# Altium footprint library TimeCard-NIC-V1.PcbLib: 104 footprints (part 1 of 7)
Each footprint in its own frame and in the unit in brackets; x right, y up, seen from the top. Pads: shape width x height; smd on the part's side, far side on the other; paste and mask are expansions set on the pad; w line width, h text height; cw(c..) or ccw(c..) is an arc to the next point about the centre after c.
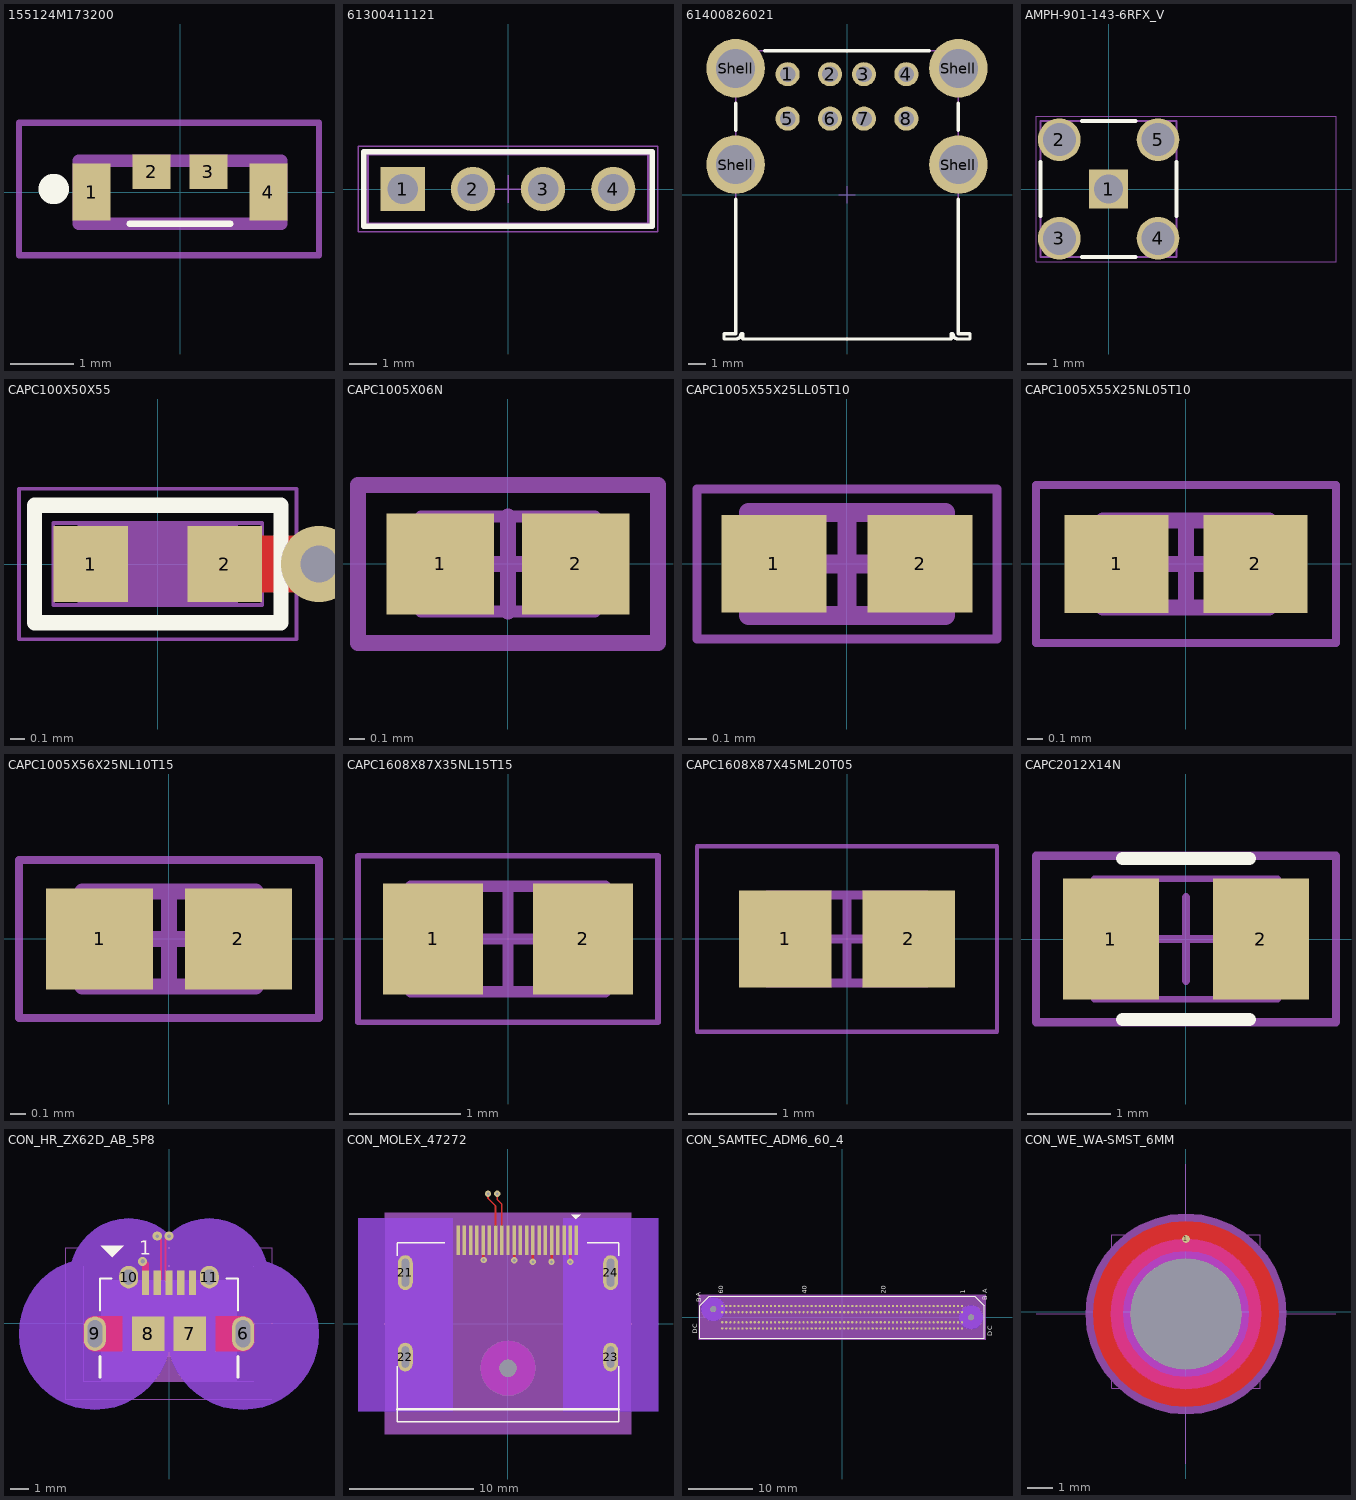
[diagram p0: the footprints below, top view; thin cyan lines are the x and y axes]

## 155124M173200 [mm]
height 1.7
pads (4):
  rect 0.6x0.9 smd: 1(-1.4,0) 4(1.4,0)
  rect 0.6x0.55 smd: 2(-0.45,0.325) 3(0.45,0.325)
Top Overlay:
  lines w0.1: -0.8,-0.5 0.8,-0.5
  lines w0.381: -2,0 cw(c-2,0.05) -2,0.1 cw(c-2,0.05) -2,0
Mechanical 13:
  lines w0.2: -1.6,-0.5 1.6,-0.5 1.6,0.5 -1.6,0.5 -1.6,-0.5
Mechanical 15:
  lines w0.1: -2.55,-1 2.2,-1 2.2,1.1 -2.55,1.1 -2.55,-1
3D body "155124M173200.stp": height 0.5, standoff -0.5, extent -1.6,0 1.6,1.49

## 61300411121 [mm] "Pin Header, pitch 2.54 mm, THT, Vertical, single row, 4p"
height 8.54
pads (4):
  rect 1.6x1.6 hole 1.1: 1(-3.81,0)
  round 1.6 hole 1.1: 2(-1.27,0) 3(1.27,0) 4(3.81,0)
Top Overlay:
  lines w0.2: -5.23,-1.345 5.23,-1.345 5.23,1.345 -5.23,1.345 -5.23,-1.345
Mechanical 13:
  lines w0.1: -5.08,-1.27 -5.08,1.27 5.08,1.27 5.08,-1.27 -5.08,-1.27
Mechanical 15:
  lines w0.05: -0.5,0 0.5,0 ; 0,-0.5 0,0.5 ; -5.43,-1.545 -5.43,1.545 5.43,1.545 5.43,-1.545 -5.43,-1.545
3D body "61300411121.stp": height 8.57, standoff -2.97, extent -5.08,-1.27 5.08,1.27

## 61400826021 [mm] "USB 2.0 Type A Horizontal Dual Stacked"
height 15.34
pads (12):
  round 1.42 hole 0.92: 1(-3.5,7.11) 2(-1,7.11) 3(1,7.11) 4(3.5,7.11) 5(-3.5,4.49) 6(-1,4.49) 7(1,4.49) 8(3.5,4.49)
  round 3.45 hole 2.3: Shell(-6.57,1.78) Shell(-6.57,7.46) Shell(6.57,1.78) Shell(6.57,7.46)
Top Overlay:
  lines w0.2: -6.55,-0.25 -6.55,-8.2 -7.25,-8.2 -7.25,-8.5 -6.56,-8.5 ccw(c-6.55,-8.2) -6.25,-8.2 -6.15,-8.2 -6.15,-8.5 6.15,-8.5 6.15,-8.2 6.25,-8.2 ccw(c6.55,-8.2) 6.56,-8.5 7.25,-8.5 7.25,-8.2 6.55,-8.2 6.55,-0.25 ; -6.55,3.81 -6.55,5.4 ; -4.85,8.5 4.85,8.5 ; 6.55,3.81 6.55,5.4
Mechanical 13:
  lines w0.1: -7.25,-8.5 -6.56,-8.5 ccw(c-6.55,-8.2) -6.25,-8.2 -6.15,-8.2 -6.15,-8.5 6.15,-8.5 6.15,-8.2 6.25,-8.2 ccw(c6.55,-8.2) 6.56,-8.5 7.25,-8.5 7.25,-8.2 6.55,-8.2 6.55,8.5 -6.55,8.5 -6.55,-8.2 -7.25,-8.2 -7.25,-8.5
Mechanical 15:
  lines w0.05: -0.5,0 0.5,0 ; 0,-0.5 0,0.5
3D body "61400826021.stp": height 15.93, standoff -3.91, extent -7.912,-8.5 7.912,8.65

## AMPH-901-143-6RFX_V [mm] "THD, 5-Leads, Body 7x7mm, Pitch 2.54mm"
height 9.86
pads (5):
  rect 2x2 hole 1.5: 1(0,0)
  round 2.2 hole 1.7: 2(-2.54,2.54) 3(-2.54,-2.54) 4(2.54,-2.54) 5(2.54,2.54)
Top Overlay:
  lines w0.2: -3.5,-1.38 -3.5,1.38 ; -1.38,-3.5 1.38,-3.5 ; -1.38,3.5 1.38,3.5 ; 3.5,-1.38 3.5,1.38
Mechanical 13:
  lines w0.1: -3.5,-3.5 3.5,-3.5 3.5,3.5 -3.5,3.5 -3.5,-3.5
Mechanical 15:
  lines w0.05: -3.74,-3.74 11.7,-3.74 11.7,3.74 -3.74,3.74 -3.74,-3.74
3D body: height 9.86, standoff 0, extent -3.55,-3.55 3.55,3.55

## CAPC100X50X55 [mm] "CAPC100X50X55"
height 10.85
pads (2):
  rect 0.5x0.51 smd: 1(-0.45,0) 2(0.45,0)
via 1.081,0 diameter 0.508 hole 0.249
Top Layer:
  lines w0.381: 0.45,0 1.081,0
Top Overlay:
  lines w0.102: -0.826,-0.394 0.826,-0.394 0.826,0.394 -0.826,0.394 -0.826,-0.394
  text ".Designator" at -0.762,0.889 h0.76
Top 3D Body:
  region: -0.525,-0.275 -0.525,0.275 0.525,0.275 0.525,-0.275
Top Courtyard:
  lines w0.025: -0.7,-0.275 -0.7,0.275 0.7,0.275 0.7,-0.275 -0.7,-0.275
Top Assembly:
  lines w0.025: -0.525,-0.275 -0.525,0.275 0.525,0.275 0.525,-0.275 -0.525,-0.275
Top Component Center:
  circle w0.025: c0,0 r0.18
Bottom Component Center:
  text "2" at 0.45,-0.254 h0.64
  text "1" at -0.45,-0.254 h0.64
Top Component Outline:
  text "CHECKED: C. HENLEY 7/29/10" at -12.446,5.309 h0.64
  text "PADSTACKS: R50_51" at -12.522,10.287 h0.64
  text "DIM IN INCH [MM]" at -12.522,7.747 h0.64
  text "COMP HT: 55 mm" at -12.522,12.827 h0.64
  text "SYMB NAME: 0402" at -12.522,15.367 h0.64
  text "MFR:AVX" at -12.522,17.907 h0.64
  text "UPDATED SOLDERMASK TO BE .1016 OVER PAD." at -21.9,-3.9 h0.64
Mechanical 30:
  lines w0.025: -0.93,-0.505 -0.93,0.505 0.93,0.505 0.93,-0.505 -0.93,-0.505
3D body: height 3.81, standoff 0, extent -0.525,-0.275 0.525,0.275

## CAPC1005X06N [mm] "Chip Capacitor, 0402, 2-Leads, Body 1.00x0.50mm, IPC Medium Density"
height 0.6
pads (2):
  rect 0.68x0.64 smd: 1(-0.43,0) 2(0.43,0)
Mechanical 13:
  lines w0.076: -0.55,-0.3 0.55,-0.3 0.55,0.3 -0.55,0.3 -0.55,-0.3
  text ".Designator" at 2.208,-0.516 h1.02
Mechanical 15:
  lines w0.102: -0.3,0 0.3,0 ; 0,-0.3 0,0.3 ; -0.95,-0.5 0.95,-0.5 0.95,0.5 -0.95,0.5 -0.95,-0.5
3D body: height 0.6, standoff 0, extent 0.32,-0.3 0.55,0.3
3D body: height 0.6, standoff 0, extent -0.55,-0.3 -0.32,0.3
3D body: height 0.6, standoff 0, extent -0.32,-0.3 0.32,0.3

## CAPC1005X55X25LL05T10 [mm] "Chip Capacitor, 2-Leads, Body 1.00x0.50mm, IPC High Density"
height 0.55
pads (2):
  rect 0.56x0.52 smd: 1(-0.39,0) 2(0.39,0)
Mechanical 13:
  lines w0.1: -0.525,-0.275 -0.525,0.275 0.525,0.275 0.525,-0.275 -0.525,-0.275
Mechanical 15:
  lines w0.05: -0.8,-0.4 -0.8,0.4 0.8,0.4 0.8,-0.4 -0.8,-0.4
  lines w0.1: -0.275,0 0.275,0 ; 0,-0.275 0,0.275
3D body: height 0.55, standoff 0, extent -0.275,-0.275 0.275,0.275
3D body: height 0.55, standoff 0, extent -0.525,-0.275 -0.275,0.275
3D body: height 0.55, standoff 0, extent 0.275,-0.275 0.525,0.275

## CAPC1005X55X25NL05T10 [mm] "Chip Capacitor, 2-Leads, Body 1.00x0.50mm, IPC Medium Density"
height 0.55
pads (2):
  rect 0.66x0.62 smd: 1(-0.44,0) 2(0.44,0)
Mechanical 13:
  lines w0.1: -0.525,-0.275 -0.525,0.275 0.525,0.275 0.525,-0.275 -0.525,-0.275
Mechanical 15:
  lines w0.05: -0.95,-0.5 -0.95,0.5 0.95,0.5 0.95,-0.5 -0.95,-0.5
  lines w0.1: -0.275,0 0.275,0 ; 0,-0.275 0,0.275
3D body: height 0.55, standoff 0, extent -0.275,-0.275 0.275,0.275
3D body: height 0.55, standoff 0, extent -0.525,-0.275 -0.275,0.275
3D body: height 0.55, standoff 0, extent 0.275,-0.275 0.525,0.275

## CAPC1005X56X25NL10T15 [mm] "Chip Capacitor, 2-Leads, Body 1.00x0.50mm, IPC Medium Density"
height 0.56
pads (2):
  rect 0.68x0.64 smd: 1(-0.44,0) 2(0.44,0)
Mechanical 13:
  lines w0.1: -0.55,-0.3 -0.55,0.3 0.55,0.3 0.55,-0.3 -0.55,-0.3
Mechanical 15:
  lines w0.05: -0.95,-0.5 -0.95,0.5 0.95,0.5 0.95,-0.5 -0.95,-0.5
  lines w0.1: -0.3,0 0.3,0 ; 0,-0.3 0,0.3
3D body: height 0.56, standoff 0, extent -0.3,-0.3 0.3,0.3
3D body: height 0.56, standoff 0, extent -0.55,-0.3 -0.3,0.3
3D body: height 0.56, standoff 0, extent 0.3,-0.3 0.55,0.3

## CAPC1608X87X35NL15T15 [mm] "Chip Capacitor, 2-Leads, Body 1.60x0.80mm, IPC Medium Density"
height 0.87
pads (2):
  rect 0.9x1 smd: 1(-0.675,0) 2(0.675,0)
Mechanical 13:
  lines w0.1: -0.875,-0.475 -0.875,0.475 0.875,0.475 0.875,-0.475 -0.875,-0.475
Mechanical 15:
  lines w0.05: -1.35,-0.75 -1.35,0.75 1.35,0.75 1.35,-0.75 -1.35,-0.75
  lines w0.1: -0.475,0 0.475,0 ; 0,-0.475 0,0.475
3D body: height 0.87, standoff 0, extent -0.525,-0.475 0.525,0.475
3D body: height 0.87, standoff 0, extent -0.875,-0.475 -0.525,0.475
3D body: height 0.87, standoff 0, extent 0.525,-0.475 0.875,0.475

## CAPC1608X87X45ML20T05 [mm] "Chip Capacitor, 2-Leads, Body 1.60x0.80mm, IPC Low Density"
height 0.87
pads (2):
  rect 1.05x1.1 smd: 1(-0.7,0) 2(0.7,0)
Mechanical 13:
  lines w0.1: -0.9,-0.5 0.9,-0.5 0.9,0.5 -0.9,0.5 -0.9,-0.5
Mechanical 15:
  lines w0.05: -1.7,-1.05 1.7,-1.05 1.7,1.05 -1.7,1.05 -1.7,-1.05
  lines w0.1: -0.5,0 0.5,0 ; 0,-0.5 0,0.5
3D body: height 0.87, standoff 0, extent 0.45,-0.5 0.9,0.5
3D body: height 0.87, standoff 0, extent -0.9,-0.5 -0.45,0.5
3D body: height 0.87, standoff 0, extent -0.45,-0.5 0.45,0.5

## CAPC2012X14N [mm] "Chip Capacitor, 0805, 2-Leads, Body 2.00x1.25mm, IPC Medium Density"
height 1.4
pads (2):
  rect 1.15x1.45 smd: 1(-0.9,0) 2(0.9,0)
Top Overlay:
  lines w0.152: -0.762,-0.965 0.762,-0.965 ; -0.762,0.965 0.762,0.965
Mechanical 13:
  lines w0.076: -1.1,-0.725 -1.1,0.725 1.1,0.725 1.1,-0.725 -1.1,-0.725
  text ".Designator" at -0.475,-0.325 h1.02
Mechanical 15:
  lines w0.102: -0.5,0 0.5,0 ; 0,-0.5 0,0.5 ; -1.8,-1 -1.8,1 1.8,1 1.8,-1 -1.8,-1
3D body: height 1.4, standoff 0, extent -0.6,-0.725 0.6,0.725
3D body: height 1.4, standoff 0, extent -1.1,-0.725 -0.6,0.725
3D body: height 1.4, standoff 0, extent 0.6,-0.725 1.1,0.725

## CON_HR_ZX62D_AB_5P8 [mm] "CON_HR_ZX62D_AB_5P8"
height 10.85
pads (11):
  rect 0.4x1.35 smd: 1(-1.3,2.235) 2(-0.65,2.235) 3(0,2.235) 4(0.65,2.235) 5(1.3,2.235)
  oval 1.23x1.9 hole 1.499 slot 0.813 at 0 deg: 6(4.089,-0.567) 9(-4.089,-0.567)
  rect 1.8x1.9 smd: 7(1.156,-0.567) 8(-1.156,-0.567)
  oval 1.05x1.25 hole 0.838 slot 0.66 at 0 deg: 10(-2.226,2.558) 11(2.226,2.558)
via -1.46,3.421 diameter 0.508 hole 0.249
via -0.65,4.818 diameter 0.5 hole 0.203
via 0,4.818 diameter 0.5 hole 0.203
Top Layer:
  region: 4.699,-0.921 4.699,-0.209 4.699,-0.088 4.605,0.136 4.434,0.306 4.21,0.399 4.089,0.399 2.591,0.399 2.591,-1.532 4.089,-1.532 4.211,-1.531 4.435,-1.438 4.606,-1.267 4.699,-1.042
  region: -4.699,-0.921 -4.699,-0.209 -4.699,-0.088 -4.605,0.136 -4.434,0.306 -4.21,0.399 -4.089,0.399 -2.591,0.399 -2.591,-1.532 -4.089,-1.532 -4.211,-1.531 -4.435,-1.438 -4.606,-1.267 -4.699,-1.042
  lines w0.114: -0.65,2.235 -0.445,2.441 -0.445,4.613 -0.65,4.818 ; 0,2.235 -0.191,2.426 -0.191,4.628 0,4.818
  lines w0.381: -1.46,3.421 -1.3,3.261 -1.3,2.235
Top Layer keep-out:
  region: -3.683,-1.829 -3.683,-1.575 -2.54,-1.575 -2.54,-0.788 -2.159,-0.788 -2.159,-1.575 -0.127,-1.575 -0.127,-0.763 0.127,-0.763 0.127,-1.575 2.159,-1.575 2.159,0.457 0.127,0.457 0.127,-0.178 -0.127,-0.178 -0.127,0.457 -2.159,0.457 -2.159,-0.178 -2.54,-0.178 -2.54,0.457 -3.683,0.457 -3.683,1.346 -1.651,1.346 -1.651,1.219 1.651,1.219 1.651,1.346 3.683,1.346 3.683,0.457 2.54,0.457 2.54,-1.575 3.683,-1.575 3.683,-1.829
Bottom Layer keep-out:
  region: 1.018,2.558 0.978,3.065 0.859,3.56 0.664,4.03 0.398,4.464 0.068,4.852 -0.319,5.182 -0.753,5.448 -1.224,5.643 -1.719,5.762 -2.226,5.802 -2.734,5.762 -3.229,5.643 -3.699,5.448 -3.844,5.359 -4.133,5.182 -4.52,4.852 -4.851,4.464 -5.117,4.03 -5.311,3.56 -5.43,3.065 -5.47,2.558 -5.43,2.05 -5.311,1.555 -5.117,1.085 -4.851,0.651 -4.52,0.264 -4.133,-0.067 -3.844,-0.244 -3.699,-0.333 -3.229,-0.528 -2.734,-0.646 -2.226,-0.686 -1.719,-0.646 -1.224,-0.528 -0.753,-0.333 -0.319,-0.067 0.068,0.264 0.398,0.651 0.664,1.085 0.859,1.555 0.978,2.05
  region: 5.47,2.558 5.43,3.065 5.311,3.56 5.117,4.03 4.851,4.464 4.52,4.852 4.133,5.182 3.699,5.448 3.229,5.643 2.734,5.762 2.226,5.802 1.719,5.762 1.224,5.643 0.753,5.448 0.609,5.359 0.319,5.182 -0.068,4.852 -0.398,4.464 -0.664,4.03 -0.859,3.56 -0.978,3.065 -1.018,2.558 -0.978,2.05 -0.859,1.555 -0.664,1.085 -0.398,0.651 -0.068,0.264 0.319,-0.067 0.609,-0.244 0.753,-0.333 1.224,-0.528 1.719,-0.646 2.226,-0.686 2.734,-0.646 3.229,-0.528 3.699,-0.333 4.133,-0.067 4.52,0.264 4.851,0.651 5.117,1.085 5.311,1.555 5.43,2.05
  region: 0.104,-0.567 0.068,-0.019 -0.039,0.519 -0.215,1.038 -0.458,1.53 -0.762,1.986 -1.124,2.399 -1.537,2.76 -1.993,3.065 -2.485,3.308 -3.004,3.484 -3.542,3.591 -4.089,3.627 -4.637,3.591 -5.175,3.484 -5.694,3.308 -6.186,3.065 -6.642,2.76 -7.055,2.399 -7.416,1.986 -7.721,1.53 -7.964,1.038 -8.14,0.519 -8.247,-0.019 -8.283,-0.567 -8.247,-1.114 -8.14,-1.652 -7.964,-2.171 -7.721,-2.663 -7.416,-3.119 -7.055,-3.532 -6.642,-3.893 -6.186,-4.198 -5.694,-4.441 -5.175,-4.617 -4.637,-4.724 -4.089,-4.76 -3.542,-4.724 -3.004,-4.617 -2.485,-4.441 -1.993,-4.198 -1.537,-3.893 -1.124,-3.532 -0.762,-3.119 -0.458,-2.663 -0.215,-2.171 -0.039,-1.652 0.068,-1.114
  region: 8.283,-0.567 8.247,-0.019 8.14,0.519 7.964,1.038 7.721,1.53 7.416,1.986 7.055,2.399 6.642,2.76 6.186,3.065 5.694,3.308 5.175,3.484 4.637,3.591 4.089,3.627 3.542,3.591 3.004,3.484 2.485,3.308 1.993,3.065 1.537,2.76 1.124,2.399 0.762,1.986 0.458,1.53 0.215,1.038 0.039,0.519 -0.068,-0.019 -0.104,-0.567 -0.068,-1.114 0.039,-1.652 0.215,-2.171 0.458,-2.663 0.762,-3.119 1.124,-3.532 1.537,-3.893 1.993,-4.198 2.485,-4.441 3.004,-4.617 3.542,-4.724 4.089,-4.76 4.637,-4.724 5.175,-4.617 5.694,-4.441 6.186,-4.198 6.642,-3.893 7.055,-3.532 7.416,-3.119 7.721,-2.663 7.964,-2.171 8.14,-1.652 8.247,-1.114
Top Overlay:
  dashed: -2.488,4.298 -3.758,4.298 -3.123,3.663
  lines w0.102: -3.81,0.711 -3.81,2.489 -3.175,2.489 ; 3.175,2.489 3.81,2.489 3.81,0.711
  lines w0.152: -3.81,-2.972 -3.81,-1.829 ; 3.81,-2.972 3.81,-1.829
  text "1" at -1.638,3.802 h0.76
Top Solder:
  dashed: -4.699,-0.921 -4.699,-0.209 -4.699,-0.088 -4.605,0.136 -4.434,0.306 -4.21,0.399 -4.089,0.399 -2.591,0.399 -2.591,-1.532 -4.089,-1.532 -4.211,-1.531 -4.435,-1.438 -4.606,-1.267 -4.699,-1.042
  dashed: 4.699,-0.921 4.699,-0.209 4.699,-0.088 4.605,0.136 4.434,0.306 4.21,0.399 4.089,0.399 2.591,0.399 2.591,-1.532 4.089,-1.532 4.211,-1.531 4.435,-1.438 4.606,-1.267 4.699,-1.042
Top 3D Body:
  region: -3.746,2.405 3.746,2.405 3.746,-3.183 -3.746,-3.183
Top Courtyard:
  lines w0.025: -4.704,-3.183 4.704,-3.183 4.704,3.183 -4.704,3.183 -4.704,-3.183
Top Assembly:
  lines w0.025: -3.746,-3.183 3.746,-3.183 3.746,2.405 -3.746,2.405 -3.746,-3.183
  text ".Designator" at -1.016,-2.845 h1.27
Bottom Component Center:
  text "5" at 1.046,2.235 h0.64
  text "3" at -0.254,2.235 h0.64
  text "1" at -1.554,2.235 h0.64
  text "4" at 0.396,2.235 h0.64
  text "2" at -0.904,2.235 h0.64
  text "6" at 3.835,-0.567 h0.64
  text "9" at -4.343,-0.567 h0.64
  text "10" at -3.19,2.431 h0.64
  text "8" at -1.41,-0.567 h0.64
  text "7" at 0.902,-0.567 h0.64
  text "11" at 1.539,2.431 h0.64
Mechanical 26:
  lines w0.025: -5.704,-4.183 5.704,-4.183 5.704,4.183 -5.704,4.183 -5.704,-4.183
Top Component Outline:
  text "MFR:HIROSE ELECTRIC" at -11.811,45.796 h0.64
  text "SYM NAME: CON_ZX62D_AB_5P8" at -11.811,43.256 h0.64
  text "COMP HT:110 MIL" at -11.811,40.716 h0.64
  text "PADSTACKS:R16_53. R71_75" at -11.684,38.43 h0.64
  text "DIM IN INCH [MM]" at -11.76,33.909 h0.64
  text "CREATED BY: C. HENLEY 10-28-2011" at -11.76,31.369 h0.64
  text "CHECKED BY: C. LOVATO 10-29-2011" at -11.633,28.829 h0.64
  text "PADSTACKS:B42_50H26_33, B48_76H32_60" at -11.684,36.144 h0.64
  text "UPDATE TO CORRECT TOLERANCE ON PADSTACK 4-22-16 C. HENLEY" at -11.938,26.238 h0.64
  text "CONVERTED TO METRIC AND VARIOUS UPDATES FOR 2018 LIBRARY." at -9.652,23.698 h0.64
3D body: height 3.81, standoff 0, extent -3.746,-3.183 3.746,2.405

## CON_MOLEX_47272 [mm] "CON_MOLEX_47272"
height 10.85
pads (25):
  rect 0.28x2.4 smd: 1(5.502,6.69) 2(5.002,6.69) 3(4.503,6.69) 4(4.002,6.69) 5(3.502,6.69) 6(3.002,6.69) 7(2.502,6.69) 8(2.003,6.69) 9(1.502,6.69) 10(1.002,6.69) 11(0.502,6.69) 12(0.002,6.69) 13(-0.497,6.69) 14(-0.998,6.69) 15(-1.498,6.69) 16(-1.998,6.69) 17(-2.498,6.69) 18(-2.997,6.69) 19(-3.498,6.69) 20(-3.998,6.69)
  oval 1.2x2.8 hole 2.235 slot 0.61 at 0 deg: 21(-8.247,4.09) 24(8.252,4.09)
  oval 1.2x2.3 hole 1.702 slot 0.61 at 0 deg: 22(-8.247,-2.69) 23(8.252,-2.69)
  round 1.4 hole 1.397 unplated: ""(0.002,-3.59)
via 5.002,4.959 diameter 0.508 hole 0.249
via -1.958,5.109 diameter 0.508 hole 0.249
via -1.602,10.423 diameter 0.5 hole 0.203
via -0.866,10.423 diameter 0.5 hole 0.203
via 0.502,5.079 diameter 0.508 hole 0.249
via 2.003,4.959 diameter 0.508 hole 0.249
via 3.502,4.959 diameter 0.508 hole 0.249
Top Layer:
  lines w0.132: -1.602,10.423 -1.602,10.069 -0.998,9.464 -0.998,6.69 ; -0.866,10.423 -0.866,9.968 -0.497,9.599 -0.497,6.69
  lines w0.203: -1.998,6.69 -1.998,5.255 -1.958,5.216 -1.958,5.109 ; 0.502,5.079 0.502,6.69 ; 2.003,4.959 2.003,6.69 ; 3.502,4.959 3.502,6.69 ; 5.002,4.959 5.002,6.69
Bottom Layer keep-out:
  region: 4.453,8.445 12.052,8.445 12.052,-7.045 4.453,-7.045
  region: -12.047,8.445 -4.448,8.445 -4.448,-7.045 -12.047,-7.045
Top Overlay:
  dashed: 5.463,8.366 5.082,8.747 5.844,8.747
  lines w0.102: -8.893,-3.445 -8.893,-7.89 8.898,-7.89 8.898,-3.445 ; -8.893,5.445 -8.893,6.5 -5.078,6.5 ; 6.352,6.5 8.898,6.5 8.898,5.445
  lines w0.2: -8.893,-6.87 8.898,-6.87
Top 3D Body:
  region: -8.898,6.5 -8.898,-7.89 8.898,-7.89 8.898,6.5
Top Courtyard:
  dashed: -8.893,-7.89 8.898,-7.89 8.898,7.89 -8.893,7.89
Multi-Layer keep-out:
  region: -2.192,-3.59 -2.15,-4.018 -2.025,-4.43 -1.823,-4.809 -1.55,-5.142 -1.217,-5.415 -0.837,-5.618 -0.426,-5.743 0.002,-5.785 0.431,-5.743 0.842,-5.618 1.095,-5.483 1.222,-5.415 1.555,-5.142 1.828,-4.809 2.03,-4.43 2.155,-4.018 2.197,-3.59 2.155,-3.162 2.03,-2.75 1.828,-2.371 1.555,-2.038 1.222,-1.765 1.095,-1.697 0.842,-1.562 0.431,-1.437 0.002,-1.395 -0.426,-1.437 -0.837,-1.562 -1.217,-1.765 -1.55,-2.038 -1.823,-2.371 -2.025,-2.75 -2.15,-3.162
Top Assembly:
  dashed: 5.082,8.747 5.844,8.747 5.463,8.366
  lines w0.025: -8.893,-7.89 8.898,-7.89 8.898,6.5 -8.893,6.5 -8.893,-7.89
  text ".Designator" at -0.455,9.915 h1.02
Bottom Component Center:
  text "2" at 5.61,6.69 h0.64
  text "5" at 4.11,6.69 h0.64
  text "8" at 2.611,6.69 h0.64
  text "11" at 1.833,6.455 h0.64
  text "16" at -0.667,7.055 h0.64
  text "23" at 9.583,-2.945 h0.64
  text "22" at -6.917,-2.945 h0.64
  text "24" at 7.998,4.09 h0.64
  text "21" at -8.501,4.09 h0.64
  text "19" at -2.167,6.455 h0.64
  text "18" at -1.667,7.055 h0.64
  text "13" at 0.833,6.455 h0.64
  text "14" at 0.333,7.055 h0.64
  text "3" at 5.111,6.69 h0.64
  text "10" at 2.334,7.055 h0.64
  text "4" at 4.61,6.69 h0.64
  text "6" at 3.61,6.69 h0.64
  text "9" at 2.11,6.69 h0.64
  text "12" at 1.333,7.055 h0.64
  text "7" at 3.11,6.69 h0.64
  text "1" at 6.11,6.69 h0.64
  text "17" at -1.167,6.455 h0.64
  text "15" at -0.166,6.455 h0.64
  text "20" at -2.666,7.055 h0.64
Mechanical 26:
  dashed: -9.892,-8.89 9.897,-8.89 9.897,8.89 -9.892,8.89
Top Component Outline:
  text "CONVERTION CHECKED BY: C.HENLEY 7-10-20" at -17.798,14.21 h1.02
  text "CONVERTED BY: GI 07-08-20" at -17.898,16.11 h1.02
  text "MFR:MOLEX 472720001" at -18.053,27.85 h1.02
  text "SYM NAME: CON_MOLEX_47272" at -18.053,25.945 h1.02
  text "COMP HT:6.65MM" at -18.053,24.04 h1.02
  text "DIM IN MM" at -17.853,22.025 h1.02
  text "CREATED BY: CGN 05-01-13" at -17.853,20.12 h1.02
  text "CHECKED BY: C. HENLEY 5-3-13" at -17.853,18.215 h1.02
3D body: height 3.81, standoff 0, extent -8.898,-7.89 8.898,6.5

## CON_SAMTEC_ADM6_60_4 [mm] "CON_SAMTEC_ADM6_60_4"
pads (242):
  round 0.356 smd: A1(18.732,1.75) A2(18.098,1.75) A3(17.462,1.75) A4(16.828,1.75) A5(16.192,1.75) A6(15.557,1.75) A7(14.922,1.75) A8(14.287,1.75) A9(13.652,1.75) A10(13.018,1.75) A11(12.383,1.75) A12(11.747,1.75) A13(11.112,1.75) A14(10.477,1.75) A15(9.842,1.75) A16(9.207,1.75) A17(8.572,1.75) A18(7.938,1.75) A19(7.302,1.75) A20(6.667,1.75) A21(6.032,1.75) A22(5.397,1.75) A23(4.763,1.75) A24(4.127,1.75) A25(3.492,1.75) A26(2.857,1.75) A27(2.222,1.75) A28(1.587,1.75) A29(0.953,1.75) A30(0.318,1.75) A31(-0.318,1.75) A32(-0.953,1.75) A33(-1.587,1.75) A34(-2.222,1.75) A35(-2.857,1.75) A36(-3.492,1.75) A37(-4.127,1.75) A38(-4.763,1.75) A39(-5.397,1.75) A40(-6.032,1.75) A41(-6.667,1.75) A42(-7.302,1.75) A43(-7.938,1.75) A44(-8.572,1.75) A45(-9.207,1.75) A46(-9.842,1.75) A47(-10.477,1.75) A48(-11.112,1.75) A49(-11.747,1.75) A50(-12.383,1.75) A51(-13.018,1.75) A52(-13.652,1.75) A53(-14.287,1.75) A54(-14.922,1.75) A55(-15.557,1.75) A56(-16.192,1.75) A57(-16.828,1.75) A58(-17.462,1.75) A59(-18.098,1.75) A60(-18.732,1.75) B1(18.732,0.79) B2(18.098,0.79) B3(17.462,0.79) B4(16.828,0.79) B5(16.192,0.79) B6(15.557,0.79) B7(14.922,0.79) B8(14.287,0.79) B9(13.652,0.79) B10(13.018,0.79) B11(12.383,0.79) B12(11.747,0.79) B13(11.112,0.79) B14(10.477,0.79) B15(9.842,0.79) B16(9.207,0.79) B17(8.572,0.79) B18(7.938,0.79) B19(7.302,0.79) B20(6.667,0.79) B21(6.032,0.79) B22(5.397,0.79) B23(4.763,0.79) B24(4.127,0.79) B25(3.492,0.79) B26(2.857,0.79) B27(2.222,0.79) B28(1.587,0.79) B29(0.953,0.79) B30(0.318,0.79) B31(-0.318,0.79) B32(-0.953,0.79) B33(-1.587,0.79) B34(-2.222,0.79) B35(-2.857,0.79) B36(-3.492,0.79) B37(-4.127,0.79) B38(-4.763,0.79) B39(-5.397,0.79) B40(-6.032,0.79) B41(-6.667,0.79) B42(-7.302,0.79) B43(-7.938,0.79) B44(-8.572,0.79) B45(-9.207,0.79) B46(-9.842,0.79) B47(-10.477,0.79) B48(-11.112,0.79) B49(-11.747,0.79) B50(-12.383,0.79) B51(-13.018,0.79) B52(-13.652,0.79) B53(-14.287,0.79) B54(-14.922,0.79) B55(-15.557,0.79) B56(-16.192,0.79) B57(-16.828,0.79) B58(-17.462,0.79) B59(-18.098,0.79) B60(-18.732,0.79) C1(18.732,-0.79) C2(18.098,-0.79) C3(17.462,-0.79) C4(16.828,-0.79) C5(16.192,-0.79) C6(15.557,-0.79) C7(14.922,-0.79) C8(14.287,-0.79) C9(13.652,-0.79) C10(13.018,-0.79) C11(12.383,-0.79) C12(11.747,-0.79) C13(11.112,-0.79) C14(10.477,-0.79) C15(9.842,-0.79) C16(9.207,-0.79) C17(8.572,-0.79) C18(7.938,-0.79) C19(7.302,-0.79) C20(6.667,-0.79) C21(6.032,-0.79) C22(5.397,-0.79) C23(4.763,-0.79) C24(4.127,-0.79) C25(3.492,-0.79) C26(2.857,-0.79) C27(2.222,-0.79) C28(1.587,-0.79) C29(0.953,-0.79) C30(0.318,-0.79) C31(-0.318,-0.79) C32(-0.953,-0.79) C33(-1.587,-0.79) C34(-2.222,-0.79) C35(-2.857,-0.79) C36(-3.492,-0.79) C37(-4.127,-0.79) C38(-4.763,-0.79) C39(-5.397,-0.79) C40(-6.032,-0.79) C41(-6.667,-0.79) C42(-7.302,-0.79) C43(-7.938,-0.79) C44(-8.572,-0.79) C45(-9.207,-0.79) C46(-9.842,-0.79) C47(-10.477,-0.79) C48(-11.112,-0.79) C49(-11.747,-0.79) C50(-12.383,-0.79) C51(-13.018,-0.79) C52(-13.652,-0.79) C53(-14.287,-0.79) C54(-14.922,-0.79) C55(-15.557,-0.79) C56(-16.192,-0.79) C57(-16.828,-0.79) C58(-17.462,-0.79) C59(-18.098,-0.79) C60(-18.732,-0.79) D1(18.732,-1.75) D2(18.098,-1.75) D3(17.462,-1.75) D4(16.828,-1.75) D5(16.192,-1.75) D6(15.557,-1.75) D7(14.922,-1.75) D8(14.287,-1.75) D9(13.652,-1.75) D10(13.018,-1.75) D11(12.383,-1.75) D12(11.747,-1.75) D13(11.112,-1.75) D14(10.477,-1.75) D15(9.842,-1.75) D16(9.207,-1.75) D17(8.572,-1.75) D18(7.938,-1.75) D19(7.302,-1.75) D20(6.667,-1.75) D21(6.032,-1.75) D22(5.397,-1.75) D23(4.763,-1.75) D24(4.127,-1.75) D25(3.492,-1.75) D26(2.857,-1.75) D27(2.222,-1.75) D28(1.587,-1.75) D29(0.953,-1.75) D30(0.318,-1.75) D31(-0.318,-1.75) D32(-0.953,-1.75) D33(-1.587,-1.75) D34(-2.222,-1.75) D35(-2.857,-1.75) D36(-3.492,-1.75) D37(-4.127,-1.75) D38(-4.763,-1.75) D39(-5.397,-1.75) D40(-6.032,-1.75) D41(-6.667,-1.75) D42(-7.302,-1.75) D43(-7.938,-1.75) D44(-8.572,-1.75) D45(-9.207,-1.75) D46(-9.842,-1.75) D47(-10.477,-1.75) D48(-11.112,-1.75) D49(-11.747,-1.75) D50(-12.383,-1.75) D51(-13.018,-1.75) D52(-13.652,-1.75) D53(-14.287,-1.75) D54(-14.922,-1.75) D55(-15.557,-1.75) D56(-16.192,-1.75) D57(-16.828,-1.75) D58(-17.462,-1.75) D59(-18.098,-1.75) D60(-18.732,-1.75)
  round 0.95 hole 0.95 unplated: ""(-20.135,1.27) ""(20.135,0)
Bottom Layer keep-out:
  region: -20.135,3.116 -20.495,3.081 -20.842,2.976 -21.161,2.805 -21.441,2.576 -21.67,2.296 -21.841,1.977 -21.946,1.63 -21.981,1.27 -21.946,0.91 -21.841,0.563 -21.727,0.351 -21.67,0.244 -21.441,-0.036 -21.161,-0.265 -20.842,-0.436 -20.495,-0.541 -20.135,-0.576 -19.775,-0.541 -19.428,-0.436 -19.109,-0.265 -18.829,-0.036 -18.6,0.244 -18.543,0.351 -18.429,0.563 -18.324,0.91 -18.289,1.27 -18.324,1.63 -18.429,1.977 -18.6,2.296 -18.829,2.576 -19.109,2.805 -19.428,2.976 -19.775,3.081
  region: 20.135,1.846 19.775,1.811 19.428,1.706 19.109,1.535 18.829,1.306 18.6,1.026 18.429,0.707 18.324,0.36 18.289,0 18.324,-0.36 18.429,-0.707 18.543,-0.919 18.6,-1.026 18.829,-1.306 19.109,-1.535 19.428,-1.706 19.775,-1.811 20.135,-1.846 20.495,-1.811 20.842,-1.706 21.161,-1.535 21.441,-1.306 21.67,-1.026 21.727,-0.919 21.841,-0.707 21.946,-0.36 21.981,0 21.946,0.36 21.841,0.707 21.67,1.026 21.441,1.306 21.161,1.535 20.842,1.706 20.495,1.811
Top Overlay:
  lines w0.102: -22.21,-3.3 22.21,-3.3 22.21,1.831 20.741,3.3 -20.741,3.3 -22.21,1.831 -22.21,-3.3
  text "40" at -5.521,3.686 h0.76
  text "20" at 6.798,3.686 h0.76
  text "A" at -22.06,3.169 h0.76
  text "B" at -22.009,2.356 h0.76
  text "C" at -22.664,-1.709 h0.76
  text "D" at -22.677,-2.586 h0.76
  text "D" at 23.428,-3.008 h0.76
  text "C" at 23.428,-2.008 h0.76
  text "B" at 22.702,2.673 h0.76
  text "A" at 22.652,3.75 h0.76
  text "60" at -18.602,3.686 h0.76
  text "1" at 19.244,3.686 h0.76
  text ".Designator" at -20.437,4.166 h0.76
Top 3D Body:
  region: -21.41,-2.5 -21.41,1.5 -20.41,2.5 20.41,2.5 21.41,1.5 21.41,-2.5
Top Courtyard:
  dashed: -21.41,-2.5 21.41,-2.5 21.41,1.5 20.41,2.5 -20.41,2.5 -21.41,1.5
Top Assembly:
  dashed: 19.29,2.07 19.175,2.047 19.078,1.982 19.013,1.885 18.99,1.77 19.013,1.655 19.035,1.623 19.078,1.558 19.175,1.493 19.29,1.47 19.405,1.493 19.502,1.558 19.545,1.623 19.567,1.655 19.59,1.77 19.567,1.885 19.502,1.982 19.405,2.047
  lines w0.025: -21.41,-2.5 -21.41,1.5 -20.41,2.5 20.41,2.5 21.41,1.5 21.41,-2.5 -21.41,-2.5
Bottom Component Center:
  text "D42" at -6.923,-3.582 h0.64
  text "A44" at -8.193,-0.082 h0.64
  text "B42" at -6.923,-1.042 h0.64
  text "C44" at -8.193,-2.622 h0.64
  text "D60" at -18.353,-3.582 h0.64
  text "D59" at -17.718,-3.582 h0.64
  text "B59" at -17.718,-1.042 h0.64
  text "B60" at -18.353,-1.042 h0.64
  text "B11" at 12.572,-1.027 h0.64
  text "A13" at 11.302,-0.066 h0.64
  text "C13" at 11.302,-2.606 h0.64
  text "D11" at 12.572,-3.567 h0.64
  text "B14" at 10.667,-1.027 h0.64
  text "A16" at 9.397,-0.066 h0.64
  text "C16" at 9.397,-2.606 h0.64
  text "D14" at 10.667,-3.567 h0.64
  text "B17" at 8.762,-1.027 h0.64
  text "A19" at 7.492,-0.066 h0.64
  text "C19" at 7.492,-2.606 h0.64
  text "D17" at 8.762,-3.567 h0.64
  text "B20" at 6.857,-1.027 h0.64
  text "A22" at 5.587,-0.066 h0.64
  text "C22" at 5.587,-2.606 h0.64
  text "D20" at 6.857,-3.567 h0.64
  text "B23" at 4.952,-1.027 h0.64
  text "A25" at 3.682,-0.066 h0.64
  text "C25" at 3.682,-2.606 h0.64
  text "D23" at 4.952,-3.567 h0.64
  text "B26" at 3.047,-1.027 h0.64
  text "A28" at 1.777,-0.066 h0.64
  text "C28" at 1.777,-2.606 h0.64
  text "D26" at 3.047,-3.567 h0.64
  text "B29" at 1.142,-1.027 h0.64
  text "A31" at 0.062,-0.082 h0.64
  text "C31" at 0.062,-2.622 h0.64
  text "D29" at 1.142,-3.567 h0.64
  text "B32" at -0.573,-1.042 h0.64
  text "A34" at -1.843,-0.082 h0.64
  text "C34" at -1.843,-2.622 h0.64
  text "D32" at -0.573,-3.582 h0.64
  text "B35" at -2.478,-1.042 h0.64
  text "A37" at -3.748,-0.082 h0.64
  text "C37" at -3.748,-2.622 h0.64
  text "D35" at -2.478,-3.582 h0.64
  text "B38" at -4.383,-1.042 h0.64
  text "A40" at -5.653,-0.082 h0.64
  text "C40" at -5.653,-2.622 h0.64
  text "D38" at -4.383,-3.582 h0.64
  text "B41" at -6.288,-1.042 h0.64
  text "B43" at -7.558,-1.042 h0.64
  text "A43" at -7.558,-0.082 h0.64
  text "C43" at -7.558,-2.622 h0.64
  text "D41" at -6.288,-3.582 h0.64
  text "D43" at -7.558,-3.582 h0.64
  text "A45" at -8.828,-0.082 h0.64
  text "C45" at -8.828,-2.622 h0.64
  text "B47" at -10.098,-1.042 h0.64
  text "A49" at -11.368,-0.082 h0.64
  text "C49" at -11.368,-2.622 h0.64
  text "D47" at -10.098,-3.582 h0.64
  text "B51" at -12.638,-1.042 h0.64
  text "D51" at -12.638,-3.582 h0.64
  text "A53" at -13.908,-0.082 h0.64
  text "C53" at -13.908,-2.622 h0.64
  text "B55" at -15.178,-1.042 h0.64
  text "D55" at -15.178,-3.582 h0.64
  text "C57" at -16.448,-2.622 h0.64
  text "A57" at -16.448,-0.082 h0.64
  text "D3" at 17.652,-3.059 h0.64
  text "D4" at 17.017,-3.059 h0.64
  text "B4" at 17.017,-0.519 h0.64
  text "B3" at 17.652,-0.519 h0.64
  text "D7" at 15.112,-3.059 h0.64
  text "D8" at 14.477,-3.059 h0.64
  text "B8" at 14.477,-0.519 h0.64
  text "B7" at 15.112,-0.519 h0.64
  text "A2" at 18.287,0.442 h0.64
  text "A1" at 18.922,0.442 h0.64
  text "C1" at 18.922,-2.098 h0.64
  text "C2" at 18.287,-2.098 h0.64
  text "A6" at 15.747,0.442 h0.64
  text "A5" at 16.382,0.442 h0.64
  text "C5" at 16.382,-2.098 h0.64
  text "C6" at 15.747,-2.098 h0.64
  text "A10" at 13.207,-0.066 h0.64
  text "A9" at 13.842,0.442 h0.64
  text "C9" at 13.842,-2.098 h0.64
  text "C10" at 13.207,-2.606 h0.64
  text "A26" at 3.047,-0.066 h0.64
  text "C14" at 10.667,-2.606 h0.64
  text "D33" at -1.208,-3.582 h0.64
  text "C38" at -4.383,-2.622 h0.64
  text "D34" at -1.843,-3.582 h0.64
  text "C39" at -5.018,-2.622 h0.64
  text "D31" at 0.062,-3.582 h0.64
  text "B28" at 1.777,-1.027 h0.64
  text "D30" at 0.507,-3.567 h0.64
  text "B27" at 2.412,-1.027 h0.64
  text "B36" at -3.113,-1.042 h0.64
  text "D36" at -3.113,-3.582 h0.64
  text "B37" at -3.748,-1.042 h0.64
  text "D37" at -3.748,-3.582 h0.64
  text "A42" at -6.923,-0.082 h0.64
  text "A30" at 0.507,-0.066 h0.64
  text "A41" at -6.288,-0.082 h0.64
  text "A29" at 1.142,-0.066 h0.64
  text "D39" at -5.018,-3.582 h0.64
  text "D27" at 2.412,-3.567 h0.64
  text "D40" at -5.653,-3.582 h0.64
  text "D28" at 1.777,-3.567 h0.64
  text "A39" at -5.018,-0.082 h0.64
  text "C30" at 0.507,-2.606 h0.64
  text "A38" at -4.383,-0.082 h0.64
  text "C29" at 1.142,-2.606 h0.64
  text "B33" at -1.208,-1.042 h0.64
  text "C32" at -0.573,-2.622 h0.64
  text "B34" at -1.843,-1.042 h0.64
  text "C33" at -1.208,-2.622 h0.64
  text "C26" at 3.047,-2.606 h0.64
  text "C35" at -2.478,-2.622 h0.64
  text "C27" at 2.412,-2.606 h0.64
  text "C36" at -3.113,-2.622 h0.64
  text "B31" at 0.062,-1.042 h0.64
  text "B40" at -5.653,-1.042 h0.64
  text "D19" at 7.492,-3.567 h0.64
  text "B30" at 0.507,-1.027 h0.64
  text "B39" at -5.018,-1.042 h0.64
  text "A35" at -2.478,-0.082 h0.64
  text "A32" at -0.573,-0.082 h0.64
  text "A36" at -3.113,-0.082 h0.64
  text "A33" at -1.208,-0.082 h0.64
  text "D44" at -8.193,-3.582 h0.64
  text "D45" at -8.828,-3.582 h0.64
  text "D48" at -10.733,-3.582 h0.64
  text "D46" at -9.463,-3.582 h0.64
  text "D49" at -11.368,-3.582 h0.64
  text "D50" at -12.003,-3.582 h0.64
  text "C46" at -9.463,-2.622 h0.64
  text "C47" at -10.098,-2.622 h0.64
  text "C48" at -10.733,-2.622 h0.64
  text "C50" at -12.003,-2.622 h0.64
  text "C52" at -13.273,-2.622 h0.64
  text "C51" at -12.638,-2.622 h0.64
  text "B45" at -8.828,-1.042 h0.64
  text "B44" at -8.193,-1.042 h0.64
  text "B48" at -10.733,-1.042 h0.64
  text "B46" at -9.463,-1.042 h0.64
  text "B49" at -11.368,-1.042 h0.64
  text "B50" at -12.003,-1.042 h0.64
  text "A46" at -9.463,-0.082 h0.64
  text "A47" at -10.098,-0.082 h0.64
  text "A48" at -10.733,-0.082 h0.64
  text "A50" at -12.003,-0.082 h0.64
  text "A52" at -13.273,-0.082 h0.64
  text "A51" at -12.638,-0.082 h0.64
  text "B58" at -17.083,-1.042 h0.64
  text "B57" at -16.448,-1.042 h0.64
  text "C55" at -15.178,-2.622 h0.64
  text "C54" at -14.543,-2.622 h0.64
  text "A58" at -17.083,-0.082 h0.64
  text "A56" at -15.813,-0.082 h0.64
  text "C3" at 17.652,-2.098 h0.64
  text "C56" at -15.813,-2.622 h0.64
  text "C58" at -17.083,-2.622 h0.64
  text "A59" at -17.718,-0.082 h0.64
  text "A60" at -18.353,-0.082 h0.64
  text "B52" at -13.273,-1.042 h0.64
  text "B53" at -13.908,-1.042 h0.64
  text "D54" at -14.543,-3.582 h0.64
  text "D56" at -15.813,-3.582 h0.64
  text "C59" at -17.718,-2.622 h0.64
  text "C60" at -18.353,-2.622 h0.64
  text "D57" at -16.448,-3.582 h0.64
  text "D58" at -17.083,-3.582 h0.64
  text "D52" at -13.273,-3.582 h0.64
  text "D53" at -13.908,-3.582 h0.64
  text "B56" at -15.813,-1.042 h0.64
  text "B54" at -14.543,-1.042 h0.64
  text "C42" at -6.923,-2.622 h0.64
  text "A7" at 15.112,0.442 h0.64
  text "C4" at 17.017,-2.098 h0.64
  text "A8" at 14.477,0.442 h0.64
  text "D18" at 8.127,-3.567 h0.64
  text "C41" at -6.288,-2.622 h0.64
  text "D15" at 10.032,-3.567 h0.64
  text "B18" at 8.127,-1.027 h0.64
  text "D16" at 9.397,-3.567 h0.64
  text "B19" at 7.492,-1.027 h0.64
  text "A21" at 6.222,-0.066 h0.64
  text "D13" at 11.302,-3.567 h0.64
  text "A20" at 6.857,-0.066 h0.64
  text "D12" at 11.937,-3.567 h0.64
  text "B16" at 9.397,-1.027 h0.64
  text "C18" at 8.127,-2.606 h0.64
  text "B15" at 10.032,-1.027 h0.64
  text "C17" at 8.762,-2.606 h0.64
  text "B24" at 4.317,-1.027 h0.64
  text "A14" at 10.667,-0.066 h0.64
  text "B25" at 3.682,-1.027 h0.64
  text "A15" at 10.032,-0.066 h0.64
  text "D21" at 6.222,-3.567 h0.64
  text "C11" at 12.572,-2.606 h0.64
  text "D22" at 5.587,-3.567 h0.64
  text "C12" at 11.937,-2.606 h0.64
  text "A12" at 11.937,-0.066 h0.64
  text "B13" at 11.302,-1.027 h0.64
  text "A11" at 12.572,-0.066 h0.64
  text "B12" at 11.937,-1.027 h0.64
  text "A24" at 4.317,-0.066 h0.64
  text "B22" at 5.587,-1.027 h0.64
  text "A23" at 4.952,-0.066 h0.64
  text "B21" at 6.222,-1.027 h0.64
  text "D25" at 3.682,-3.567 h0.64
  text "A18" at 8.127,-0.066 h0.64
  text "D24" at 4.317,-3.567 h0.64
  text "A17" at 8.762,-0.066 h0.64
  text "C21" at 6.222,-2.606 h0.64
  text "C24" at 4.317,-2.606 h0.64
  text "C20" at 6.857,-2.606 h0.64
  text "C23" at 4.952,-2.606 h0.64
  text "A27" at 2.412,-0.066 h0.64
  text "C15" at 10.032,-2.606 h0.64
  text "A55" at -15.178,-0.082 h0.64
  text "A54" at -14.543,-0.082 h0.64
  text "A3" at 17.652,0.442 h0.64
  text "A4" at 17.017,0.442 h0.64
  text "B1" at 18.922,-0.519 h0.64
  text "B2" at 18.287,-0.519 h0.64
  text "B9" at 13.842,-0.519 h0.64
  text "B10" at 13.207,-1.027 h0.64
  text "D1" at 18.922,-3.059 h0.64
  text "D2" at 18.287,-3.059 h0.64
  text "D5" at 16.382,-3.059 h0.64
  text "D6" at 15.747,-3.059 h0.64
  text "D9" at 13.842,-3.059 h0.64
  text "D10" at 13.207,-3.567 h0.64
  text "C7" at 15.112,-2.098 h0.64
  text "C8" at 14.477,-2.098 h0.64
  text "B5" at 16.382,-0.519 h0.64
  text "B6" at 15.747,-0.519 h0.64
Mechanical 26:
  dashed: -22.41,-3.5 22.41,-3.5 22.41,3.5 -22.41,3.5
Top Component Outline:
  lines w0.025: -18.732,-1.75 18.732,1.75 ; -18.732,1.75 18.732,-1.75
  text "NOTES:" at -12.278,6.987 h0.64
  text "Checked By: CAROL 6-9-2020" at -12.497,8.237 h0.64
  text "Created By:GI 12/13/19" at -12.497,9.487 h0.64
  text "COMP HIGHT:3.4MM" at -12.497,10.737 h0.64
  text "SYMBOL NAME:CON_SAMTEC_ADM6_60_4" at -12.64,11.987 h0.64
  text "MFR:SAMTEC ADM6-60-015-L-4-2-A-TR" at -12.491,13.237 h0.64
3D body: height 3.81, standoff 0, extent -21.41,-2.5 21.41,2.5

## CON_WE_WA-SMST_6MM [mm] "CON_WE_WA-SMST_6MM"
height 10.85
pads (2):
  round 0.32 smd: 1(0,2.92)
  round 4.445 hole 4.445 unplated: ""(0,-0.08)
Top Layer:
  region: 3.711,-0.08 3.666,0.501 3.53,1.067 3.307,1.605 3.003,2.102 2.624,2.544 2.182,2.923 1.685,3.227 1.147,3.45 0.581,3.586 0,3.631 -0.581,3.586 -1.147,3.45 -1.685,3.227 -1.851,3.125 -2.182,2.923 -2.624,2.544 -3.003,2.102 -3.307,1.605 -3.53,1.067 -3.666,0.501 -3.711,-0.08 -3.666,-0.661 -3.53,-1.227 -3.307,-1.765 -3.003,-2.262 -2.624,-2.704 -2.182,-3.083 -1.851,-3.285 -1.685,-3.387 -1.147,-3.61 -0.581,-3.746 0,-3.791 0.581,-3.746 1.147,-3.61 1.685,-3.387 2.182,-3.083 2.624,-2.704 3.003,-2.262 3.307,-1.765 3.53,-1.227 3.666,-0.661 hole: 2.514,-0.08 2.466,0.41 2.323,0.882 2.09,1.317 1.778,1.698 1.397,2.01 0.962,2.243 0.49,2.386 0,2.434 -0.49,2.386 -0.962,2.243 -1.252,2.088 -1.252,2.088 -1.397,2.01 -1.778,1.698 -2.09,1.317 -2.323,0.882 -2.466,0.41 -2.514,-0.08 -2.466,-0.57 -2.323,-1.042 -2.09,-1.477 -1.778,-1.858 -1.397,-2.17 -1.252,-2.248 -1.252,-2.248 -0.962,-2.403 -0.49,-2.546 0,-2.594 0.49,-2.546 0.962,-2.403 1.397,-2.17 1.778,-1.858 2.09,-1.477 2.323,-1.042 2.466,-0.57 2.514,-0.08
Top Paste:
  dashed: -3.613,-0.48 -2.541,-0.48 -2.501,-0.678 -2.377,-1.063 -2.193,-1.423 -1.956,-1.75 -1.67,-2.036 -1.343,-2.273 -0.983,-2.457 -0.598,-2.581 -0.4,-2.621 -0.4,-3.693 -0.603,-3.67 -1.003,-3.58 -1.389,-3.445 -1.759,-3.268 -2.105,-3.05 -2.426,-2.795 -2.715,-2.506 -2.97,-2.185 -3.188,-1.839 -3.365,-1.469 -3.5,-1.083 -3.59,-0.683
  dashed: -0.4,3.533 -0.4,2.461 -0.598,2.421 -0.983,2.297 -1.343,2.113 -1.67,1.876 -1.956,1.59 -2.193,1.263 -2.377,0.903 -2.501,0.518 -2.541,0.32 -3.613,0.32 -3.59,0.523 -3.5,0.923 -3.365,1.309 -3.188,1.679 -2.97,2.025 -2.715,2.346 -2.426,2.635 -2.105,2.89 -1.759,3.108 -1.389,3.285 -1.003,3.42 -0.603,3.51
  dashed: 3.613,0.32 2.541,0.32 2.501,0.518 2.377,0.903 2.193,1.263 1.956,1.59 1.67,1.876 1.343,2.113 0.983,2.297 0.598,2.421 0.4,2.461 0.4,3.533 0.603,3.51 1.003,3.42 1.389,3.285 1.759,3.108 2.105,2.89 2.426,2.635 2.715,2.346 2.97,2.025 3.188,1.679 3.365,1.309 3.5,0.923 3.59,0.523
  dashed: 0.4,-3.693 0.4,-2.621 0.598,-2.581 0.983,-2.457 1.343,-2.273 1.67,-2.036 1.956,-1.75 2.193,-1.423 2.377,-1.063 2.501,-0.678 2.541,-0.48 3.613,-0.48 3.59,-0.683 3.5,-1.083 3.365,-1.469 3.188,-1.839 2.97,-2.185 2.715,-2.506 2.426,-2.795 2.105,-3.05 1.759,-3.268 1.389,-3.445 1.003,-3.58 0.603,-3.67
  dashed: -3.613,-0.48 -2.541,-0.48 -2.501,-0.678 -2.377,-1.063 -2.193,-1.423 -1.956,-1.75 -1.67,-2.036 -1.343,-2.273 -0.983,-2.457 -0.598,-2.581 -0.4,-2.621 -0.4,-3.693 -0.603,-3.67 -1.003,-3.58 -1.389,-3.445 -1.759,-3.268 -2.105,-3.05 -2.426,-2.795 -2.715,-2.506 -2.97,-2.185 -3.188,-1.839 -3.365,-1.469 -3.5,-1.083 -3.59,-0.683
Top Solder:
  dashed: 4.012,-0.08 3.963,0.548 3.816,1.16 3.575,1.742 3.246,2.278 2.837,2.757 2.358,3.166 1.822,3.495 1.24,3.736 0.628,3.883 0,3.932 -0.628,3.883 -1.24,3.736 -1.822,3.495 -2.001,3.385 -2.358,3.166 -2.837,2.757 -3.246,2.278 -3.575,1.742 -3.816,1.16 -3.963,0.548 -4.012,-0.08 -3.963,-0.708 -3.816,-1.32 -3.575,-1.902 -3.246,-2.438 -2.837,-2.917 -2.358,-3.326 -2.001,-3.545 -1.822,-3.655 -1.24,-3.896 -0.628,-4.043 0,-4.092 0.628,-4.043 1.24,-3.896 1.822,-3.655 2.358,-3.326 2.837,-2.917 3.246,-2.438 3.575,-1.902 3.816,-1.32 3.963,-0.708
Bottom Solder:
  dashed: 5.113,-0.08 5.069,0.587 4.938,1.243 4.723,1.876 4.428,2.476 4.056,3.032 3.615,3.535 3.112,3.976 2.556,4.348 1.956,4.643 1.323,4.858 0.667,4.989 0,5.033 -0.667,4.989 -1.323,4.858 -1.956,4.643 -2.556,4.348 -3.112,3.976 -3.615,3.535 -4.056,3.032 -4.428,2.476 -4.723,1.876 -4.938,1.243 -5.069,0.587 -5.113,-0.08 -5.069,-0.747 -4.938,-1.403 -4.723,-2.036 -4.428,-2.636 -4.056,-3.192 -3.615,-3.695 -3.112,-4.136 -2.556,-4.508 -1.956,-4.803 -1.323,-5.018 -0.667,-5.149 0,-5.193 0.667,-5.149 1.323,-5.018 1.956,-4.803 2.556,-4.508 3.112,-4.136 3.615,-3.695 4.056,-3.192 4.428,-2.636 4.723,-2.036 4.938,-1.403 5.069,-0.747
Top 3D Body:
  region: 3.009,-0.08 2.972,0.391 2.862,0.85 2.681,1.286 2.435,1.689 2.128,2.048 1.769,2.355 1.366,2.601 0.93,2.782 0.471,2.892 0,2.929 -0.471,2.892 -0.93,2.782 -1.366,2.601 -1.501,2.519 -1.769,2.355 -2.128,2.048 -2.435,1.689 -2.681,1.286 -2.862,0.85 -2.972,0.391 -3.009,-0.08 -2.972,-0.551 -2.862,-1.01 -2.681,-1.446 -2.435,-1.849 -2.128,-2.208 -1.769,-2.515 -1.501,-2.679 -1.366,-2.761 -0.93,-2.942 -0.471,-3.052 0,-3.089 0.471,-3.052 0.93,-2.942 1.366,-2.761 1.769,-2.515 2.128,-2.208 2.435,-1.849 2.681,-1.446 2.862,-1.01 2.972,-0.551
Top Courtyard:
  lines w0.025: -2.965,-3.045 -2.965,3.08 2.965,3.08 2.965,-3.045 -2.965,-3.045
Multi-Layer keep-out:
  region: 3.009,-0.08 2.972,0.391 2.862,0.85 2.681,1.286 2.435,1.689 2.128,2.048 1.769,2.355 1.366,2.601 0.93,2.782 0.471,2.892 0,2.929 -0.471,2.892 -0.93,2.782 -1.366,2.601 -1.501,2.519 -1.769,2.355 -2.128,2.048 -2.435,1.689 -2.681,1.286 -2.862,0.85 -2.972,0.391 -3.009,-0.08 -2.972,-0.551 -2.862,-1.01 -2.681,-1.446 -2.435,-1.849 -2.128,-2.208 -1.769,-2.515 -1.501,-2.679 -1.366,-2.761 -0.93,-2.942 -0.471,-3.052 0,-3.089 0.471,-3.052 0.93,-2.942 1.366,-2.761 1.769,-2.515 2.128,-2.208 2.435,-1.849 2.681,-1.446 2.862,-1.01 2.972,-0.551
Top Assembly:
  lines w0.025: -3,-0.08 cw(c0,-0.08) 0,2.92 cw(c0,-0.08) 3,-0.08 cw(c0,-0.08) 0,-3.08 cw(c0,-0.08) -3,-0.08
  text ".Designator" at -0.9,7.12 h0.76
Top Component Center:
  lines w0.025: -6,-0.08 6,-0.08 ; 0,-6.08 0,5.92
Bottom Component Center:
  text "1" at -0.614,3.32 h1.14
Mechanical 26:
  dashed: 4.012,-0.08 3.963,0.548 3.816,1.16 3.575,1.742 3.246,2.278 2.837,2.757 2.358,3.166 1.822,3.495 1.24,3.736 0.628,3.883 0,3.932 -0.628,3.883 -1.24,3.736 -1.822,3.495 -2.001,3.385 -2.358,3.166 -2.837,2.757 -3.246,2.278 -3.575,1.742 -3.816,1.16 -3.963,0.548 -4.012,-0.08 -3.963,-0.708 -3.816,-1.32 -3.575,-1.902 -3.246,-2.438 -2.837,-2.917 -2.358,-3.326 -2.001,-3.545 -1.822,-3.655 -1.24,-3.896 -0.628,-4.043 0,-4.092 0.628,-4.043 1.24,-3.896 1.822,-3.655 2.358,-3.326 2.837,-2.917 3.246,-2.438 3.575,-1.902 3.816,-1.32 3.963,-0.708
Top Component Outline:
  text "SYM NAME:CON_WE_WA-SMST_6MM" at -13.689,19.703 h0.76
  text "MFR:WURTH WA-SMST Steel Spacer w/thru hole" at -13.534,21.157 h0.76
  text "CREATED BY: SCAREY 12-28-2020" at -13.731,17.556 h0.76
  text "CHECKED BY:  CAROL 1-5-21" at -13.701,16.03 h0.76
3D body: height 3.81, standoff 0, extent -3.009,-3.089 3.009,2.929